# Altium footprint library Stepper_Board.PcbLib: 49 footprints (part 3 of 4)
Each footprint in its own frame and in the unit in brackets; x right, y up, seen from the top. Pads: shape width x height; smd on the part's side, far side on the other; paste and mask are expansions set on the pad; w line width, h text height; cw(c..) or ccw(c..) is an arc to the next point about the centre after c.
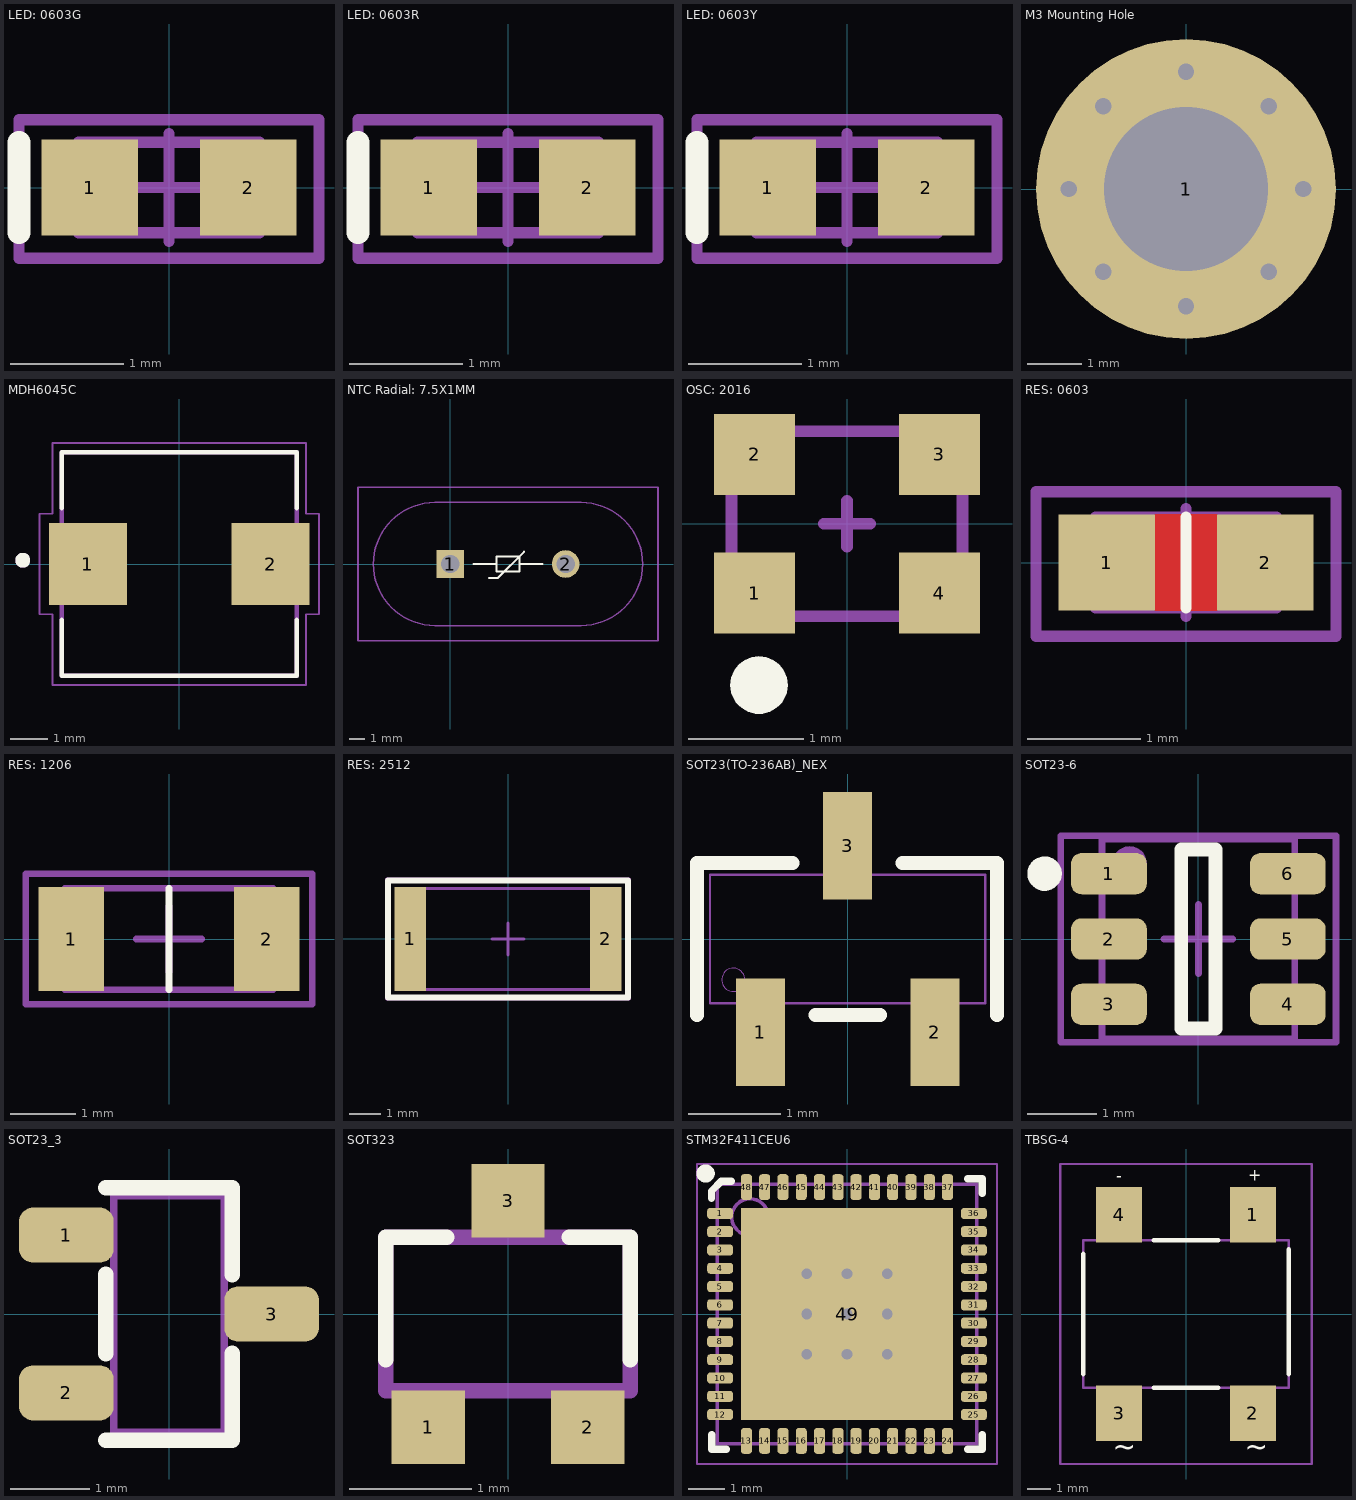
[diagram p2: the footprints below, top view; thin cyan lines are the x and y axes]

## LED: 0603G [mm]
height 0.45
pads (2):
  rect 0.85x0.85 smd: 1(-0.7,0) 2(0.7,0)
Top Overlay:
  lines w0.2: -1.325,-0.4 -1.325,0.4
Mechanical 1:
  lines w0.1: -0.8,-0.4 0.8,-0.4 0.8,0.4 -0.8,0.4 -0.8,-0.4
Mechanical 15:
  lines w0.1: -0.475,0 0.475,0 ; 0,-0.475 0,0.475 ; -1.325,-0.625 1.325,-0.625 1.325,0.6 -1.325,0.6 -1.325,-0.625
3D body "User Library-LED_0603_G.STEP": height 0.6, standoff 0, extent -0.8,-0.4 0.8,0.4

## LED: 0603R [mm]
height 0.45
pads (2):
  rect 0.85x0.85 smd: 1(-0.7,0) 2(0.7,0)
Top Overlay:
  lines w0.2: -1.325,-0.4 -1.325,0.4
Mechanical 1:
  lines w0.1: -0.8,-0.4 0.8,-0.4 0.8,0.4 -0.8,0.4 -0.8,-0.4
Mechanical 15:
  lines w0.1: -0.475,0 0.475,0 ; 0,-0.475 0,0.475 ; -1.325,-0.625 1.325,-0.625 1.325,0.6 -1.325,0.6 -1.325,-0.625
3D body "User Library-LED_0603_R.STEP": height 0.6, standoff 0, extent -0.8,-0.4 0.8,0.4

## LED: 0603Y [mm]
height 0.45
pads (2):
  rect 0.85x0.85 smd: 1(-0.7,0) 2(0.7,0)
Top Overlay:
  lines w0.2: -1.325,-0.4 -1.325,0.4
Mechanical 1:
  lines w0.1: -0.8,-0.4 -0.8,0.4 0.8,0.4 0.8,-0.4 -0.8,-0.4
Mechanical 15:
  lines w0.1: -0.475,0 0.475,0 ; 0,-0.475 0,0.475 ; -1.325,-0.625 -1.325,0.6 1.325,0.6 1.325,-0.625 -1.325,-0.625
3D body "User Library-LED_0603_Y.STEP": height 0.6, standoff 0, extent -0.8,-0.4 0.8,0.4

## M3 Mounting Hole [mm]
pads (1):
  round 5.5 hole 3: 1(0,0)
via 0,-2.15 diameter 0.6 hole 0.3
via -2.15,0 diameter 0.6 hole 0.3
via 0,2.15 diameter 0.6 hole 0.3
via 2.15,0 diameter 0.6 hole 0.3
via 1.52,-1.52 diameter 0.6 hole 0.3
via 1.52,1.52 diameter 0.6 hole 0.3
via -1.52,1.52 diameter 0.6 hole 0.3
via -1.52,-1.52 diameter 0.6 hole 0.3
Mechanical 1:
  circle w0.05: c0,0 r2.15

## MDH6045C [mm]
pads (2):
  rect 2.1x2.2 smd: 1(-2.45,0) 2(2.45,0)
Top Overlay:
  circle w0.2: c-4.2,0.1 r0.1
  lines w0.127: -3.15,-1.5 -3.15,-3 3.15,-3 3.15,-1.5 ; -3.15,1.5 -3.15,3 3.15,3 3.15,1.5
Mechanical 13:
  circle w0.2: c-4.2,0.1 r0.1
  lines w0.127: -3.15,-3 -3.15,3 3.15,3 3.15,-3 -3.15,-3
Mechanical 15:
  lines w0.05: -3.75,-1.35 -3.75,1.35 -3.4,1.35 -3.4,3.25 3.4,3.25 3.4,1.35 3.75,1.35 3.75,-1.35 3.4,-1.35 3.4,-3.25 -3.4,-3.25 -3.4,-1.35 -3.75,-1.35
3D body "MDH6045C-470MA%3DP3.STEP": height 4.78, standoff -0.02, extent -3.151,-3.048 3.151,2.952

## NTC Radial: 7.5X1MM [mm]
pads (2):
  rect 1.8x1.8 hole 1.2: 1(0,0)
  round 1.8 hole 1.2: 2(7.5,0)
Top Overlay:
  lines w0.127: 1.5,0 3,0 ; 2.5,-0.9 3.1,-0.9 4.8,0.8 ; 3,0 3,0.5 4.5,0.5 4.5,0 ; 3,0 3,-0.5 4.5,-0.5 4.5,0 ; 4.5,0 6,0 4.5,0
Mechanical 13:
  lines w0.1: -1,-4 cw(c-1,0) -1,4 8.5,4 cw(c8.5,0) 8.5,-4 -1,-4
Mechanical 15:
  lines w0.1: -6,-5 -6,5 13.5,5 13.5,-5 -6,-5
3D body "BN-LG15Y6R0MYB.stp": height 23.1, standoff -5, extent -5,-4 12.5,4

## OSC: 2016 [mm]
pads (5):
  rect 0.7x0.7 smd: 1(-0.8,-0.6) 2(-0.8,0.6) 3(0.8,0.6) 4(0.8,-0.6)
  round 0.5 on Top Overlay: ""(-0.762,-1.397)
Mechanical 1:
  lines w0.1: -1,-0.8 -1,0.8 1,0.8 1,-0.8 -1,-0.8
Mechanical 15:
  lines w0.1: -0.2,0 0.2,0 ; 0,-0.2 0,0.2 ; -1,-0.8 -1,0.8 1,0.8 1,-0.8 -1,-0.8
3D body "User Library-XRCGB27M000F2P00R0.STEP": height 0.65, standoff 0, extent -1,-0.8 1,0.8

## RES: 0603 [mm]
height 0.45
pads (2):
  rect 0.85x0.85 smd: 1(-0.7,0) 2(0.7,0)
Top Layer:
  pour cut-out: -0.275,0.425 -0.275,-0.425 0.275,-0.425 0.275,0.425
Top Overlay:
  lines w0.1: 0,-0.4 0,0.4
Mechanical 1:
  lines w0.1: -0.8,-0.4 -0.8,0.4 0.8,0.4 0.8,-0.4 -0.8,-0.4
Mechanical 15:
  lines w0.1: -0.475,0 0.475,0 ; 0,-0.475 0,0.475 ; -1.325,-0.65 1.325,-0.65 1.325,0.625 -1.325,0.625 -1.325,-0.65
3D body "chip_0603_r.STEP": height 0.44, standoff -0.02, extent -0.8,-0.4 0.8,0.4

## RES: 1206 [mm]
height 0.6
pads (2):
  rect 1x1.6 smd mask+0.07: 1(-1.5,0) 2(1.5,0)
Top Overlay:
  lines w0.1: 0,-0.775 0,0.775
Mechanical 1:
  lines w0.1: -1.6,-0.775 -1.6,0.775 1.6,0.775 1.6,-0.775 -1.6,-0.775
Mechanical 15:
  lines w0.1: -0.5,0 0.5,0 ; 0,-0.5 0,0.5 ; -2.2,-1 2.2,-1 2.2,1 -2.2,1 -2.2,-1
3D body "chip_1206_r.STEP": height 0.47, standoff -0.03, extent -1.65,-0.8 1.55,0.8

## RES: 2512 [mm]
height 0.55
pads (2):
  rect 1x3.3 smd: 1(-3.1,0) 2(3.1,0)
Top Overlay:
  lines w0.2: -3.8,-1.85 -3.8,1.85 3.8,1.85 3.8,-1.85 -3.8,-1.85
Mechanical 1:
  lines w0.1: -3.175,-1.6 -3.175,1.6 3.175,1.6 3.175,-1.6 -3.175,-1.6
Mechanical 15:
  lines w0.1: -0.5,0 0.5,0 ; 0,-0.5 0,0.5 ; -3.85,-1.9 3.85,-1.9 3.85,1.9 -3.85,1.9 -3.85,-1.9
3D body "chip_2512_r.STEP": height 0.52, standoff -0.04, extent -3.175,-1.6 3.175,1.6

## SOT23(TO-236AB)_NEX [mil]
pads (3):
  rect 21x46 smd paste+0 mask+0: 1(-37.4,-40) 2(37.4,-40) 3(0,40)
Top Overlay:
  lines w6: -64.58,-32.5 -64.58,32.5 -23.6,32.5 ; -13.8,-32.5 13.8,-32.5 ; 23.6,32.5 64,32.5 64,-32.5
Top 3D Body:
  circle w0: c-49,-17.5 r5
  lines w1: -59,-27.5 -59,27.5 59,27.5 59,-27.5 -59,-27.5 ; -46.9,-49 -27.9,-49 -27.9,-27.5 -46.9,-27.5 -46.9,-49 ; -9.5,27.5 -9.5,49 9.5,49 9.5,27.5 -9.5,27.5 ; 27.9,-49 46.9,-49 46.9,-27.5 27.9,-27.5 27.9,-49
3D body "SOT23TO-236AB_NEX.step": height 43.11, standoff 0, extent -59.02,-49.02 59.02,49.02

## SOT23-6 [mm] "pitch 0.95 mm"
height 1.1
pads (7):
  rrect50% 1.1x0.6 smd: 1(-1.3,0.95) 2(-1.3,0) 3(-1.3,-0.95) 4(1.3,-0.95) 5(1.3,0) 6(1.3,0.95)
  round 0.5 on Mech1: ""(-1,1.1)
Top Overlay:
  circle w0.25: c-2.235,0.95 r0.125
  lines w0.2: -0.25,-1.3 0.25,-1.3 0.25,1.3 -0.25,1.3 -0.25,-1.3
Mechanical 1:
  lines w0.1: -1.4,-1.45 -1.4,1.45 1.4,1.45 1.4,-1.45 -1.4,-1.45
Mechanical 15:
  lines w0.1: -0.5,0 0.5,0 ; 0,-0.5 0,0.5 ; -2,-1.5 -2,1.5 2,1.5 2,-1.5 -2,-1.5
3D body "User Library-SOT23-6-2.STEP": height 1.45, standoff 0, extent -1.4,-1.45 1.4,1.45

## SOT23_3 [mm]
pads (3):
  rrect50% 1.2x0.7 smd mask+0.1: 1(-1.3,1) 2(-1.3,-1) 3(1.3,0)
Top Overlay:
  lines w0.2: -0.8,-1.6 0.8,-1.6 0.8,-0.5 ; -0.8,-0.5 -0.8,0.5 ; -0.8,1.6 0.8,1.6 0.8,0.5
Mechanical 13:
  lines w0.1: -0.7,-1.5 0.7,-1.5 0.7,1.5 -0.7,1.5 -0.7,-1.5
3D body "User Library-SOT23-2.STEP": height 1.08, standoff 0, extent -1.32,-1.5 1.32,1.5

## SOT323 [mm]
pads (3):
  rect 0.6x0.6 smd: 1(-0.65,-0.925) 2(0.65,-0.925) 3(0,0.925)
Top Overlay:
  lines w0.127: -1,-0.375 -1,0.625 -0.5,0.625 ; 0.5,0.625 1,0.625 1,-0.375
Mechanical 13:
  region: 0.15,0.576 -0.15,0.576 -0.15,0.975 0.15,0.975
  region: -0.5,-0.976 -0.801,-0.976 -0.801,-0.575 -0.5,-0.575
  region: 0.8,-0.977 0.501,-0.977 0.501,-0.575 0.8,-0.575
  lines w0.127: -1,-0.625 -1,0.625 1,0.625 1,-0.625 -1,-0.625
3D body "step_temp.STEP": height 1.09, standoff -0.01, extent -1,-1.05 1,1.05

## STM32F411CEU6 [mm] "QFN, 48-Leads, Body 7.00x7.00mm, Pitch 0.50mm, Thermal Pad 5.80x5.80mm, IPC Medium Density"
height 0.6
pads (49):
  rrect50% 0.7x0.3 smd: 1(-3.47,2.75) 2(-3.47,2.25) 3(-3.47,1.75) 4(-3.47,1.25) 5(-3.47,0.75) 6(-3.47,0.25) 7(-3.47,-0.25) 8(-3.47,-0.75) 9(-3.47,-1.25) 10(-3.47,-1.75) 11(-3.47,-2.25) 12(-3.47,-2.75) 25(3.47,-2.75) 26(3.47,-2.25) 27(3.47,-1.75) 28(3.47,-1.25) 29(3.47,-0.75) 30(3.47,-0.25) 31(3.47,0.25) 32(3.47,0.75) 33(3.47,1.25) 34(3.47,1.75) 35(3.47,2.25) 36(3.47,2.75)
  rrect50% 0.3x0.7 smd: 13(-2.75,-3.47) 14(-2.25,-3.47) 15(-1.75,-3.47) 16(-1.25,-3.47) 17(-0.75,-3.47) 18(-0.25,-3.47) 19(0.25,-3.47) 20(0.75,-3.47) 21(1.25,-3.47) 22(1.75,-3.47) 23(2.25,-3.47) 24(2.75,-3.47) 37(2.75,3.47) 38(2.25,3.47) 39(1.75,3.47) 40(1.25,3.47) 41(0.75,3.47) 42(0.25,3.47) 43(-0.25,3.47) 44(-0.75,3.47) 45(-1.25,3.47) 46(-1.75,3.47) 47(-2.25,3.47) 48(-2.75,3.47)
  rect 5.8x5.8 smd: 49(0,0)
via -1.1,1.1 diameter 0.5 hole 0.3
via 0,1.1 diameter 0.5 hole 0.3
via 1.1,1.1 diameter 0.5 hole 0.3
via -1.1,0 diameter 0.5 hole 0.3
via 0,0 diameter 0.5 hole 0.3
via 1.1,0 diameter 0.5 hole 0.3
via -1.1,-1.1 diameter 0.5 hole 0.3
via 0,-1.1 diameter 0.5 hole 0.3
via 1.1,-1.1 diameter 0.5 hole 0.3
Top Overlay:
  circle w0.25: c-3.865,3.841 r0.125
  lines w0.2: -3.702,3.157 -3.702,3.362 -3.437,3.627 -3.167,3.627 ; -3.7,-3.3 -3.7,-3.7 -3.3,-3.7 ; 3.3,-3.7 3.7,-3.7 3.7,-3.3 ; 3.3,3.7 3.7,3.7 3.7,3.3
Mechanical 13:
  circle w0.1: c-2.65,2.65 r0.5
  lines w0.1: -3.55,-3.55 3.55,-3.55 3.55,3.55 -3.55,3.55 -3.55,-3.55
Mechanical 15:
  lines w0.05: -4.1,-4.1 -4.1,4.1 4.1,4.1 4.1,-4.1 -4.1,-4.1
  lines w0.1: -0.5,0 0.5,0 ; 0,-0.5 0,0.5
3D body "QFN50P700X700X60_HS-49N.step": height 0.6, standoff 0, extent -3.551,-3.551 3.551,3.551

## TBSG-4 [mm]
pads (4):
  rect 2x2.4 smd: 1(2.9,4.3) 2(2.9,-4.3) 3(-2.9,-4.3) 4(-2.9,4.3)
Top Overlay:
  lines w0.2: -4.45,-2.6 -4.45,2.6 ; -1.4,-3.2 1.4,-3.2 ; -1.4,3.2 1.4,3.2 ; 4.45,-2.6 4.45,2.8
  text "~" at 2.54,-6.477 h1.52
  text "~" at -3.175,-6.477 h1.52
  text "-" at -3.025,5.742 h0.5
  text "+" at 2.69,5.782 h0.5
Mechanical 13:
  lines w0.1: -4.45,-3.2 4.45,-3.2 4.45,3.2 -4.45,3.2 -4.45,-3.2
Mechanical 15:
  lines w0.1: -5.45,-6.5 5.45,-6.5 5.45,6.5 -5.45,6.5 -5.45,-6.5
3D body "TBSA60M-TP.stp": height 1.85, standoff 0, extent -4.45,-5.3 4.45,5.3